# Altium footprint library CRD25DA12N-FMC.PcbLib: 152 footprints (part 6 of 10)
Each footprint in its own frame and in the unit in brackets; x right, y up, seen from the top. Pads: shape width x height; smd on the part's side, far side on the other; paste and mask are expansions set on the pad; w line width, h text height; cw(c..) or ccw(c..) is an arc to the next point about the centre after c.
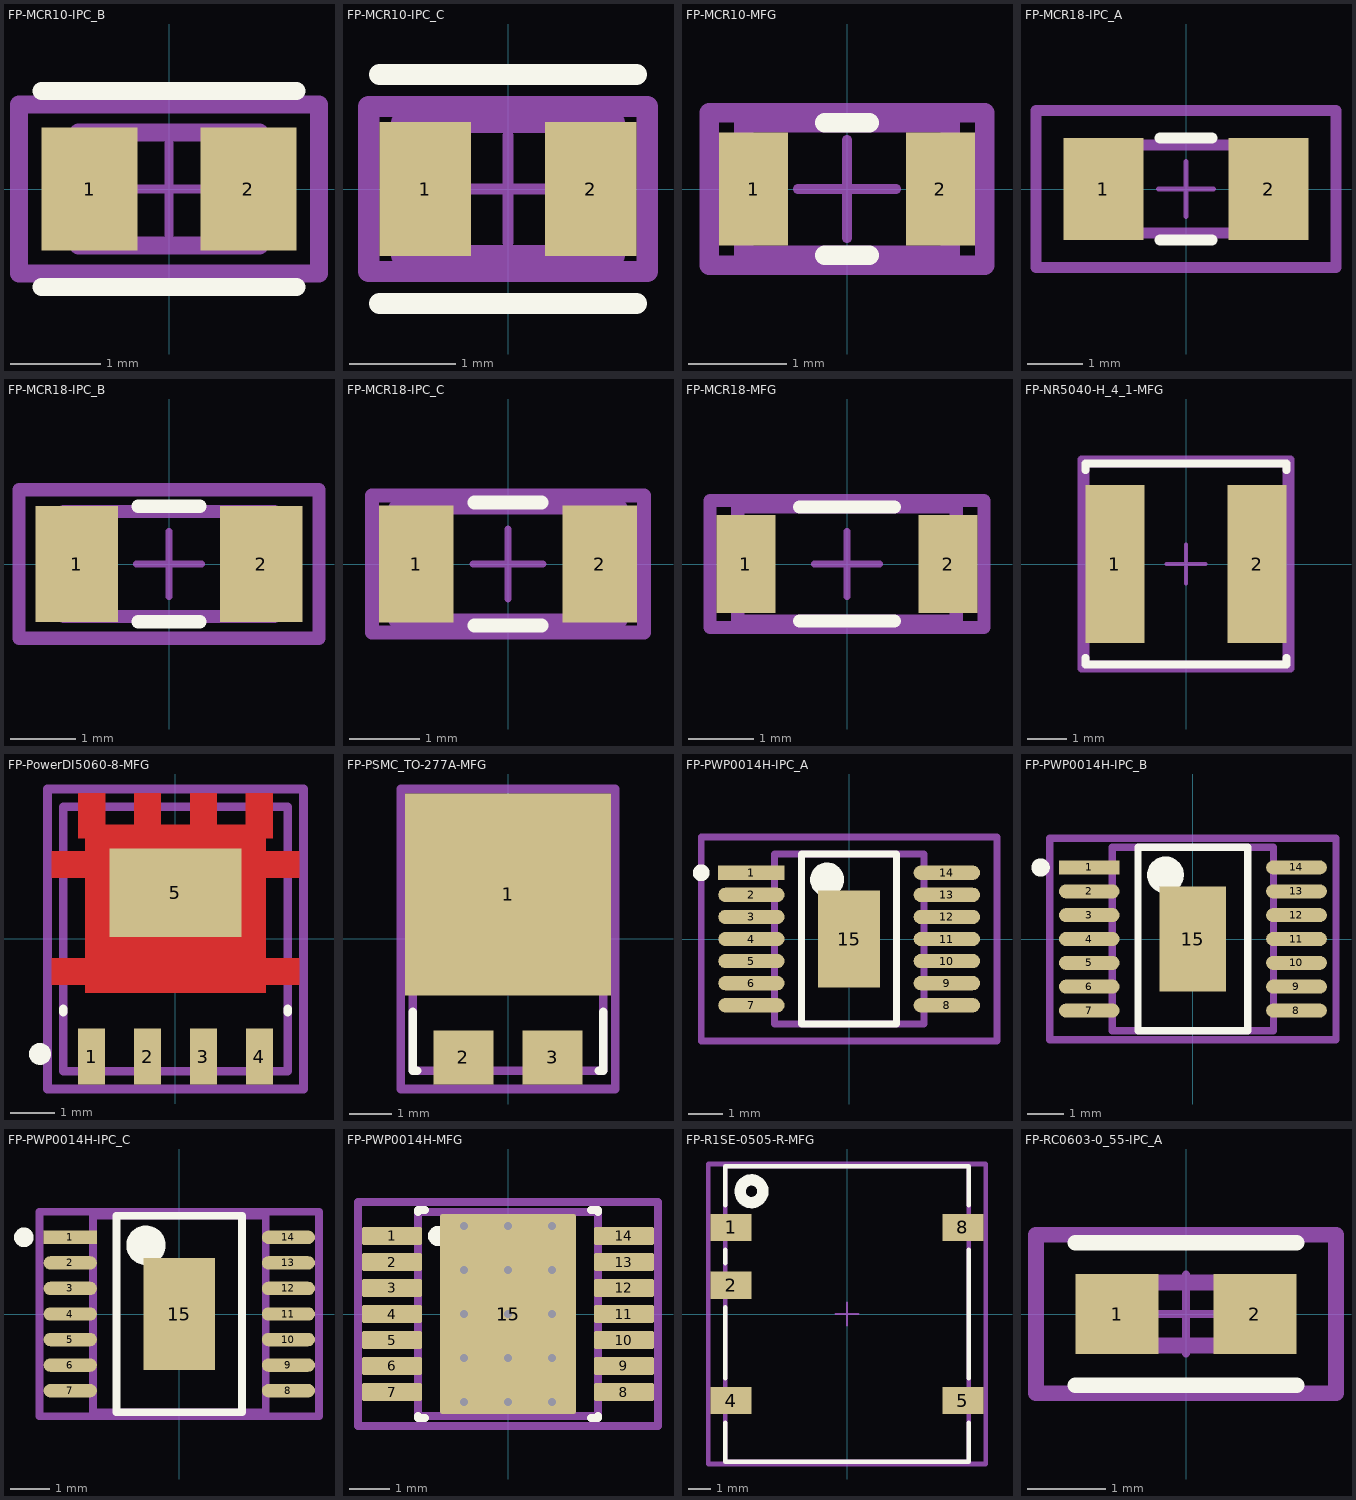
[diagram p5: the footprints below, top view; thin cyan lines are the x and y axes]

## FP-MCR10-IPC_B [mm]
pads (2):
  rect 1.058x1.362 smd paste+0 mask+0: 1(-0.877,0) 2(0.877,0)
Top Overlay:
  lines w0.2: -1.406,-1.081 1.406,-1.081 ; -1.406,1.081 1.406,1.081
Mechanical 5:
  lines w0.2: -1.656,-0.931 1.656,-0.931 1.656,0.931 -1.656,0.931 -1.656,-0.931
  text ".Designator" at 0,0.188 h1
Mechanical 13:
  lines w0.2: -1,-0.625 1,-0.625 1,0.625 -1,0.625 -1,-0.625
Mechanical 15:
  lines w0.2: -1.656,-0.931 1.656,-0.931 1.656,0.931 -1.656,0.931 -1.656,-0.931
Mechanical 16:
  lines w0.1: -0.5,0 0.5,0 ; 0,-0.5 0,0.5
3D body "Res_Rohm_MCR10ERTJ510_eec.STEP": height 0.25, standoff 0, extent -1.656,-0.931 1.656,0.931

## FP-MCR10-IPC_C [mm]
pads (2):
  rect 0.858x1.262 smd paste+0 mask+0: 1(-0.777,0) 2(0.777,0)
Top Overlay:
  lines w0.2: -1.206,-1.075 1.206,-1.075 ; -1.206,1.075 1.206,1.075
Mechanical 5:
  lines w0.2: -1.306,-0.775 -1.306,0.775 1.306,0.775 1.306,-0.775 -1.306,-0.775
  text ".Designator" at 0,0.188 h1
Mechanical 13:
  lines w0.2: -1,-0.625 -1,0.625 1,0.625 1,-0.625 -1,-0.625
Mechanical 15:
  lines w0.2: -1.306,-0.775 -1.306,0.775 1.306,0.775 1.306,-0.775 -1.306,-0.775
Mechanical 16:
  lines w0.1: -0.5,0 0.5,0 ; 0,-0.5 0,0.5
3D body "Res_Rohm_MCR10ERTJ510_eec.STEP": height 0.25, standoff 0, extent -1.306,-0.775 1.306,0.775

## FP-MCR10-MFG [mm]
pads (2):
  rect 0.7x1.15 smd paste+0 mask+0: 1(-0.95,0) 2(0.95,0)
Top Overlay:
  lines w0.2: -0.225,-0.675 0.225,-0.675 ; -0.225,0.675 0.225,0.675
Mechanical 5:
  lines w0.2: -1.4,-0.775 -1.4,0.775 1.4,0.775 1.4,-0.775 -1.4,-0.775
  text ".Designator" at 0,0.188 h1
Mechanical 13:
  lines w0.2: -1.05,-0.675 -1.05,0.675 1.05,0.675 1.05,-0.675 -1.05,-0.675
Mechanical 15:
  lines w0.2: -1.4,-0.775 -1.4,0.775 1.4,0.775 1.4,-0.775 -1.4,-0.775
Mechanical 16:
  lines w0.1: -0.5,0 0.5,0 ; 0,-0.5 0,0.5
3D body "Res_Rohm_MCR10ERTJ510_eec.STEP": height 0.25, standoff 0, extent -1.4,-0.775 1.4,0.775

## FP-MCR18-IPC_A [mm]
pads (2):
  rect 1.456x1.858 smd paste+0 mask+0: 1(-1.501,0) 2(1.501,0)
Top Overlay:
  lines w0.2: -0.473,-0.929 0.473,-0.929 ; -0.473,0.929 0.473,0.929
Mechanical 5:
  lines w0.2: -2.729,-1.429 -2.729,1.429 2.729,1.429 2.729,-1.429 -2.729,-1.429
  text ".Designator" at 0,0.188 h1
Mechanical 13:
  lines w0.2: -1.6,-0.8 -1.6,0.8 1.6,0.8 1.6,-0.8 -1.6,-0.8
Mechanical 15:
  lines w0.2: -2.729,-1.429 -2.729,1.429 2.729,1.429 2.729,-1.429 -2.729,-1.429
Mechanical 16:
  lines w0.1: -0.5,0 0.5,0 ; 0,-0.5 0,0.5
3D body "Res_Rohm_MCR18ERTFL1R10_eec.STEP": height 0.25, standoff 0, extent -2.729,-1.429 2.729,1.429

## FP-MCR18-IPC_B [mm]
pads (2):
  rect 1.256x1.758 smd paste+0 mask+0: 1(-1.401,0) 2(1.401,0)
Top Overlay:
  lines w0.2: -0.473,-0.879 0.473,-0.879 ; -0.473,0.879 0.473,0.879
Mechanical 5:
  lines w0.2: -2.279,-1.129 -2.279,1.129 2.279,1.129 2.279,-1.129 -2.279,-1.129
  text ".Designator" at 0,0.188 h1
Mechanical 13:
  lines w0.2: -1.6,-0.8 -1.6,0.8 1.6,0.8 1.6,-0.8 -1.6,-0.8
Mechanical 15:
  lines w0.2: -2.279,-1.129 -2.279,1.129 2.279,1.129 2.279,-1.129 -2.279,-1.129
Mechanical 16:
  lines w0.1: -0.5,0 0.5,0 ; 0,-0.5 0,0.5
3D body "Res_Rohm_MCR18ERTFL1R10_eec.STEP": height 0.25, standoff 0, extent -2.279,-1.129 2.279,1.129

## FP-MCR18-IPC_C [mm]
pads (2):
  rect 1.056x1.658 smd paste+0 mask+0: 1(-1.301,0) 2(1.301,0)
Top Overlay:
  lines w0.2: -0.473,-0.875 0.473,-0.875 ; -0.473,0.875 0.473,0.875
Mechanical 5:
  lines w0.2: -1.929,-0.975 1.929,-0.975 1.929,0.975 -1.929,0.975 -1.929,-0.975
  text ".Designator" at 0,0.188 h1
Mechanical 13:
  lines w0.2: -1.6,-0.8 1.6,-0.8 1.6,0.8 -1.6,0.8 -1.6,-0.8
Mechanical 15:
  lines w0.2: -1.929,-0.975 1.929,-0.975 1.929,0.975 -1.929,0.975 -1.929,-0.975
Mechanical 16:
  lines w0.1: -0.5,0 0.5,0 ; 0,-0.5 0,0.5
3D body "Res_Rohm_MCR18ERTFL1R10_eec.STEP": height 0.25, standoff 0, extent -1.929,-0.975 1.929,0.975

## FP-MCR18-MFG [mm]
pads (2):
  rect 0.9x1.5 smd paste+0 mask+0: 1(-1.55,0) 2(1.55,0)
Top Overlay:
  lines w0.2: -0.725,-0.875 0.725,-0.875 ; -0.725,0.875 0.725,0.875
Mechanical 5:
  lines w0.2: -2.1,-0.975 -2.1,0.975 2.1,0.975 2.1,-0.975 -2.1,-0.975
  text ".Designator" at 0,0.188 h1
Mechanical 13:
  lines w0.2: -1.675,-0.875 -1.675,0.875 1.675,0.875 1.675,-0.875 -1.675,-0.875
Mechanical 15:
  lines w0.2: -2.1,-0.975 -2.1,0.975 2.1,0.975 2.1,-0.975 -2.1,-0.975
Mechanical 16:
  lines w0.1: -0.5,0 0.5,0 ; 0,-0.5 0,0.5
3D body "Res_Rohm_MCR18ERTFL1R10_eec.STEP": height 0.25, standoff 0, extent -2.1,-0.975 2.1,0.975

## FP-NR5040-H_4_1-MFG [mm]
pads (2):
  rect 1.5x4 smd paste+0 mask+0: 1(-1.8,0) 2(1.8,0)
Top Overlay:
  lines w0.2: -2.55,-2.375 -2.55,-2.55 2.55,-2.55 2.55,-2.375 ; -2.55,2.375 -2.55,2.55 2.55,2.55 2.55,2.375
Mechanical 5:
  lines w0.2: -2.65,-2.65 -2.65,2.65 2.65,2.65 2.65,-2.65 -2.65,-2.65
  text ".Designator" at 0,0.188 h1
Mechanical 13:
  lines w0.2: -2.55,-2.55 -2.55,2.55 2.55,2.55 2.55,-2.55 -2.55,-2.55
Mechanical 15:
  lines w0.2: -2.65,-2.65 -2.65,2.65 2.65,2.65 2.65,-2.65 -2.65,-2.65
Mechanical 16:
  lines w0.1: -0.5,0 0.5,0 ; 0,-0.5 0,0.5
3D body "Ind_Taiyo_Yuden_NR5040T1R5N_eec.STEP": height 0.25, standoff 0, extent -2.65,-2.65 2.65,2.65

## FP-PowerDI5060-8-MFG [mm]
pads (5):
  rect 0.61x1.27 smd paste+0 mask+0: 1(-1.905,-2.67) 2(-0.635,-2.67) 3(0.635,-2.67) 4(1.905,-2.67)
  rect 3x2 smd paste+0 mask+0: 5(0,1.05)
Top Layer:
  region: 2.05,-1.215 -2.05,-1.215 -2.05,-1.035 -2.805,-1.035 -2.805,-0.435 -2.05,-0.435 -2.05,1.39 -2.805,1.39 -2.805,1.99 -2.05,1.99 -2.05,2.285 -2.21,2.285 -2.21,3.305 -1.6,3.305 -1.6,2.595 -0.94,2.595 -0.94,3.305 -0.33,3.305 -0.33,2.595 0.33,2.595 0.33,3.305 0.94,3.305 0.94,2.595 1.6,2.595 1.6,3.305 2.21,3.305 2.21,2.285 2.05,2.285 2.05,1.99 2.805,1.99 2.805,1.39 2.05,1.39 2.05,-0.435 2.805,-0.435 2.805,-1.035 2.05,-1.035
Top Overlay:
  circle w0.25: c-3.075,-2.61 r0.125
  lines w0.2: -2.55,-1.66 -2.55,-1.59 ; 2.55,-1.66 2.55,-1.59
Mechanical 5:
  lines w0.2: -2.905,-3.405 2.905,-3.405 2.905,3.405 -2.905,3.405 -2.905,-3.405
  text ".Designator" at 0,0.188 h1
Mechanical 13:
  lines w0.2: -2.55,-3 2.55,-3 2.55,3 -2.55,3 -2.55,-3
Mechanical 15:
  lines w0.2: -2.905,-3.405 2.905,-3.405 2.905,3.405 -2.905,3.405 -2.905,-3.405
Mechanical 16:
  lines w0.1: -0.5,0 0.5,0 ; 0,-0.5 0,0.5
3D body "Trans_Diodes_DMT12H007LPS-13_eec.STEP": height 0.25, standoff 0, extent -2.905,-3.405 2.905,3.405

## FP-PSMC_TO-277A-MFG [mm]
pads (3):
  rect 4.8x4.72 smd paste+0 mask+0: 1(0,1.04)
  rect 1.4x1.27 smd paste+0 mask+0: 2(-1.04,-2.765) 3(1.04,-2.765)
Top Overlay:
  lines w0.2: -2.225,-1.695 -2.225,-3.075 -2.115,-3.075 ; 2.115,-3.075 2.225,-3.075 2.225,-1.695
Mechanical 5:
  lines w0.2: -2.5,-3.5 -2.5,3.5 2.5,3.5 2.5,-3.5 -2.5,-3.5
  text ".Designator" at 0,0 h1
Mechanical 13:
  lines w0.2: -2.225,-3.075 -2.225,3.075 2.225,3.075 2.225,-3.075 -2.225,-3.075
Mechanical 15:
  lines w0.2: -2.5,-3.5 -2.5,3.5 2.5,3.5 2.5,-3.5 -2.5,-3.5
Mechanical 16:
  lines w0.1: -0.5,0 0.5,0 ; 0,-0.5 0,0.5
3D body "Diode_STMicroelectronics_STPS1045SF_eec.STEP": height 0.25, standoff 0, extent -2.5,-3.5 2.5,3.5

## FP-PWP0014H-IPC_A [mm]
pads (15):
  rect 1.955x0.421 smd paste+0 mask+0: 1(-2.875,1.95)
  rrect100% 1.955x0.421 smd paste+0 mask+0: 2(-2.875,1.3) 3(-2.875,0.65) 4(-2.875,0) 5(-2.875,-0.65) 6(-2.875,-1.3) 7(-2.875,-1.95) 8(2.875,-1.95) 9(2.875,-1.3) 10(2.875,-0.65) 11(2.875,0) 12(2.875,0.65) 13(2.875,1.3) 14(2.875,1.95)
  rect 1.82x2.86 smd paste-1000 mask+0: 15(0,0)
Top Overlay:
  circle w0.25: c-4.353,1.95 r0.125
  circle w0.5: c-0.648,1.75 r0.25
  lines w0.2: -1.398,-2.5 -1.398,2.5 1.398,2.5 1.398,-2.5 -1.398,-2.5
Top Paste:
  rectangle: -0.507,-1.027 0.507,1.027
Mechanical 5:
  lines w0.2: -4.353,-3 -4.353,3 4.353,3 4.353,-3 -4.353,-3
  text ".Designator" at 0,0.188 h1
Mechanical 13:
  lines w0.2: -2.2,-2.5 -2.2,2.5 2.2,2.5 2.2,-2.5 -2.2,-2.5
Mechanical 15:
  lines w0.2: -4.353,-3 -4.353,3 4.353,3 4.353,-3 -4.353,-3
Mechanical 16:
  lines w0.1: -0.5,0 0.5,0 ; 0,-0.5 0,0.5
3D body "IC_Texas_Instruments_ALM2402FQPWPRQ1_eec.STEP": height 0.25, standoff 0, extent -4.353,-3 4.353,3

## FP-PWP0014H-IPC_B [mm]
pads (15):
  rect 1.655x0.381 smd paste+0 mask+0: 1(-2.825,1.95)
  rrect100% 1.655x0.381 smd paste+0 mask+0: 2(-2.825,1.3) 3(-2.825,0.65) 4(-2.825,0) 5(-2.825,-0.65) 6(-2.825,-1.3) 7(-2.825,-1.95) 8(2.825,-1.95) 9(2.825,-1.3) 10(2.825,-0.65) 11(2.825,0) 12(2.825,0.65) 13(2.825,1.3) 14(2.825,1.95)
  rect 1.82x2.86 smd paste-1000 mask+0: 15(0,0)
Top Overlay:
  circle w0.5: c-0.748,1.75 r0.25
  circle w0.25: c-4.153,1.95 r0.125
  lines w0.2: -1.498,-2.5 1.498,-2.5 1.498,2.5 -1.498,2.5 -1.498,-2.5
Top Paste:
  rectangle: -0.507,-1.027 0.507,1.027
Mechanical 5:
  lines w0.2: -3.903,-2.75 3.903,-2.75 3.903,2.75 -3.903,2.75 -3.903,-2.75
  text ".Designator" at 0,0.188 h1
Mechanical 13:
  lines w0.2: -2.2,-2.5 2.2,-2.5 2.2,2.5 -2.2,2.5 -2.2,-2.5
Mechanical 15:
  lines w0.2: -3.903,-2.75 3.903,-2.75 3.903,2.75 -3.903,2.75 -3.903,-2.75
Mechanical 16:
  lines w0.1: -0.5,0 0.5,0 ; 0,-0.5 0,0.5
3D body "IC_Texas_Instruments_ALM2402FQPWPRQ1_eec.STEP": height 0.25, standoff 0, extent -3.903,-2.75 3.903,2.75

## FP-PWP0014H-IPC_C [mm]
pads (15):
  rect 1.355x0.341 smd paste+0 mask+0: 1(-2.775,1.95)
  rrect100% 1.355x0.341 smd paste+0 mask+0: 2(-2.775,1.3) 3(-2.775,0.65) 4(-2.775,0) 5(-2.775,-0.65) 6(-2.775,-1.3) 7(-2.775,-1.95) 8(2.775,-1.95) 9(2.775,-1.3) 10(2.775,-0.65) 11(2.775,0) 12(2.775,0.65) 13(2.775,1.3) 14(2.775,1.95)
  rect 1.82x2.86 smd paste-1000 mask+0: 15(0,0)
Top Overlay:
  circle w0.5: c-0.848,1.75 r0.25
  circle w0.25: c-3.953,1.95 r0.125
  lines w0.2: -1.598,-2.5 1.598,-2.5 1.598,2.5 -1.598,2.5 -1.598,-2.5
Top Paste:
  rectangle: -0.507,-1.027 0.507,1.027
Mechanical 5:
  lines w0.2: -3.553,-2.6 3.553,-2.6 3.553,2.6 -3.553,2.6 -3.553,-2.6
  text ".Designator" at 0,0.188 h1
Mechanical 13:
  lines w0.2: -2.2,-2.5 2.2,-2.5 2.2,2.5 -2.2,2.5 -2.2,-2.5
Mechanical 15:
  lines w0.2: -3.553,-2.6 3.553,-2.6 3.553,2.6 -3.553,2.6 -3.553,-2.6
Mechanical 16:
  lines w0.1: -0.5,0 0.5,0 ; 0,-0.5 0,0.5
3D body "IC_Texas_Instruments_ALM2402FQPWPRQ1_eec.STEP": height 0.25, standoff 0, extent -3.553,-2.6 3.553,2.6

## FP-PWP0014H-MFG [mm]
pads (15):
  rrect22% 1.5x0.45 smd paste+0 mask+0: 1(-2.9,1.95) 2(-2.9,1.3) 3(-2.9,0.65) 4(-2.9,0) 5(-2.9,-0.65) 6(-2.9,-1.3) 7(-2.9,-1.95) 8(2.9,-1.95) 9(2.9,-1.3) 10(2.9,-0.65) 11(2.9,0) 12(2.9,0.65) 13(2.9,1.3) 14(2.9,1.95)
  rrect3% 3.4x5 smd paste-1000 mask-1000: 15(0,0)
via 0,-2.2 diameter 0.5 hole 0.2
via 0,-1.1 diameter 0.5 hole 0.2
via 0,0 diameter 0.5 hole 0.2
via 0,1.1 diameter 0.5 hole 0.2
via 0,2.2 diameter 0.5 hole 0.2
via -1.1,-2.2 diameter 0.5 hole 0.2
via -1.1,-1.1 diameter 0.5 hole 0.2
via -1.1,0 diameter 0.5 hole 0.2
via -1.1,1.1 diameter 0.5 hole 0.2
via -1.1,2.2 diameter 0.5 hole 0.2
via 1.1,-2.2 diameter 0.5 hole 0.2
via 1.1,-1.1 diameter 0.5 hole 0.2
via 1.1,0 diameter 0.5 hole 0.2
via 1.1,1.1 diameter 0.5 hole 0.2
via 1.1,2.2 diameter 0.5 hole 0.2
Top Overlay:
  circle w0.25: c-1.75,1.95 r0.125
  lines w0.2: -2.25,-2.55 -2.25,-2.6 -2.075,-2.6 ; -2.25,2.55 -2.25,2.6 -2.075,2.6 ; 2.075,-2.6 2.25,-2.6 2.25,-2.55 ; 2.075,2.6 2.25,2.6 2.25,2.55
Top Paste:
  region: 0.91,1.38 0.91,-1.38 0.91,-1.39 0.902,-1.408 0.888,-1.422 0.87,-1.43 0.86,-1.43 -0.86,-1.43 -0.87,-1.43 -0.888,-1.422 -0.902,-1.408 -0.91,-1.39 -0.91,-1.38 -0.91,1.38 -0.91,1.39 -0.902,1.408 -0.888,1.422 -0.87,1.43 -0.86,1.43 0.86,1.43 0.87,1.43 0.888,1.422 0.902,1.408 0.91,1.39
Top Solder:
  region: 0.91,1.38 0.91,-1.38 0.91,-1.39 0.902,-1.408 0.888,-1.422 0.87,-1.43 0.86,-1.43 -0.86,-1.43 -0.87,-1.43 -0.888,-1.422 -0.902,-1.408 -0.91,-1.39 -0.91,-1.38 -0.91,1.38 -0.91,1.39 -0.902,1.408 -0.888,1.422 -0.87,1.43 -0.86,1.43 0.86,1.43 0.87,1.43 0.888,1.422 0.902,1.408 0.91,1.39
Mechanical 5:
  lines w0.2: -3.75,-2.8 -3.75,2.8 3.75,2.8 3.75,-2.8 -3.75,-2.8
  text ".Designator" at 0,0.188 h1
Mechanical 13:
  lines w0.2: -2.25,-2.55 -2.25,2.55 2.25,2.55 2.25,-2.55 -2.25,-2.55
Mechanical 15:
  lines w0.2: -3.75,-2.8 -3.75,2.8 3.75,2.8 3.75,-2.8 -3.75,-2.8
Mechanical 16:
  lines w0.1: -0.5,0 0.5,0 ; 0,-0.5 0,0.5
3D body "IC_Texas_Instruments_ALM2402FQPWPRQ1_eec.STEP": height 0.25, standoff 0, extent -3.75,-2.8 3.75,2.8

## FP-R1SE-0505-R-MFG [mm]
pads (5):
  rect 1.8x1.2 smd paste+0 mask+0: 1(-5.1,3.81) 2(-5.1,1.27) 4(-5.1,-3.81) 5(5.1,-3.81) 8(5.1,3.81)
Top Overlay:
  circle w0.5: c-4.2,5.4 r0.5
  lines w0.2: -5.35,-4.785 -5.35,-6.5 5.35,-6.5 5.35,-4.785 ; -5.35,-2.835 -5.35,0.295 ; -5.35,2.245 -5.35,2.835 ; -5.35,4.785 -5.35,6.5 5.35,6.5 5.35,4.785 ; 5.35,-2.835 5.35,2.835
Mechanical 5:
  lines w0.2: -6.1,-6.6 6.1,-6.6 6.1,6.6 -6.1,6.6 -6.1,-6.6
  text ".Designator" at 0,0.188 h1
Mechanical 13:
  lines w0.2: -5.35,-6.5 5.35,-6.5 5.35,6.5 -5.35,6.5 -5.35,-6.5
Mechanical 15:
  lines w0.2: -6.1,-6.6 6.1,-6.6 6.1,6.6 -6.1,6.6 -6.1,-6.6
Mechanical 16:
  lines w0.1: -0.5,0 0.5,0 ; 0,-0.5 0,0.5
3D body "IC_Recom_Power_R1SE-0505-R_eec.STEP": height 0.25, standoff 0, extent -6.1,-6.6 6.1,6.6

## FP-RC0603-0_55-IPC_A [mm]
pads (2):
  rect 1.059x1.012 smd paste+0 mask+0: 1(-0.877,0) 2(0.877,0)
Top Overlay:
  lines w0.2: -1.406,-0.906 1.406,-0.906 ; -1.406,0.906 1.406,0.906
Mechanical 5:
  lines w0.2: -1.906,-1.006 1.906,-1.006 1.906,1.006 -1.906,1.006 -1.906,-1.006
  text ".Designator" at 0,0.188 h1
Mechanical 13:
  lines w0.2: -0.8,-0.4 0.8,-0.4 0.8,0.4 -0.8,0.4 -0.8,-0.4
Mechanical 15:
  lines w0.2: -1.906,-1.006 1.906,-1.006 1.906,1.006 -1.906,1.006 -1.906,-1.006
Mechanical 16:
  lines w0.1: -0.5,0 0.5,0 ; 0,-0.5 0,0.5
3D body "Res_Yageo_RC0603FR-07100KL_eec.STEP": height 0.25, standoff 0, extent -1.906,-1.006 1.906,1.006